# Altium footprint library ICs.PcbLib: 86 footprints (part 4 of 6)
Each footprint in its own frame and in the unit in brackets; x right, y up, seen from the top. Pads: shape width x height; smd on the part's side, far side on the other; paste and mask are expansions set on the pad; w line width, h text height; cw(c..) or ccw(c..) is an arc to the next point about the centre after c.
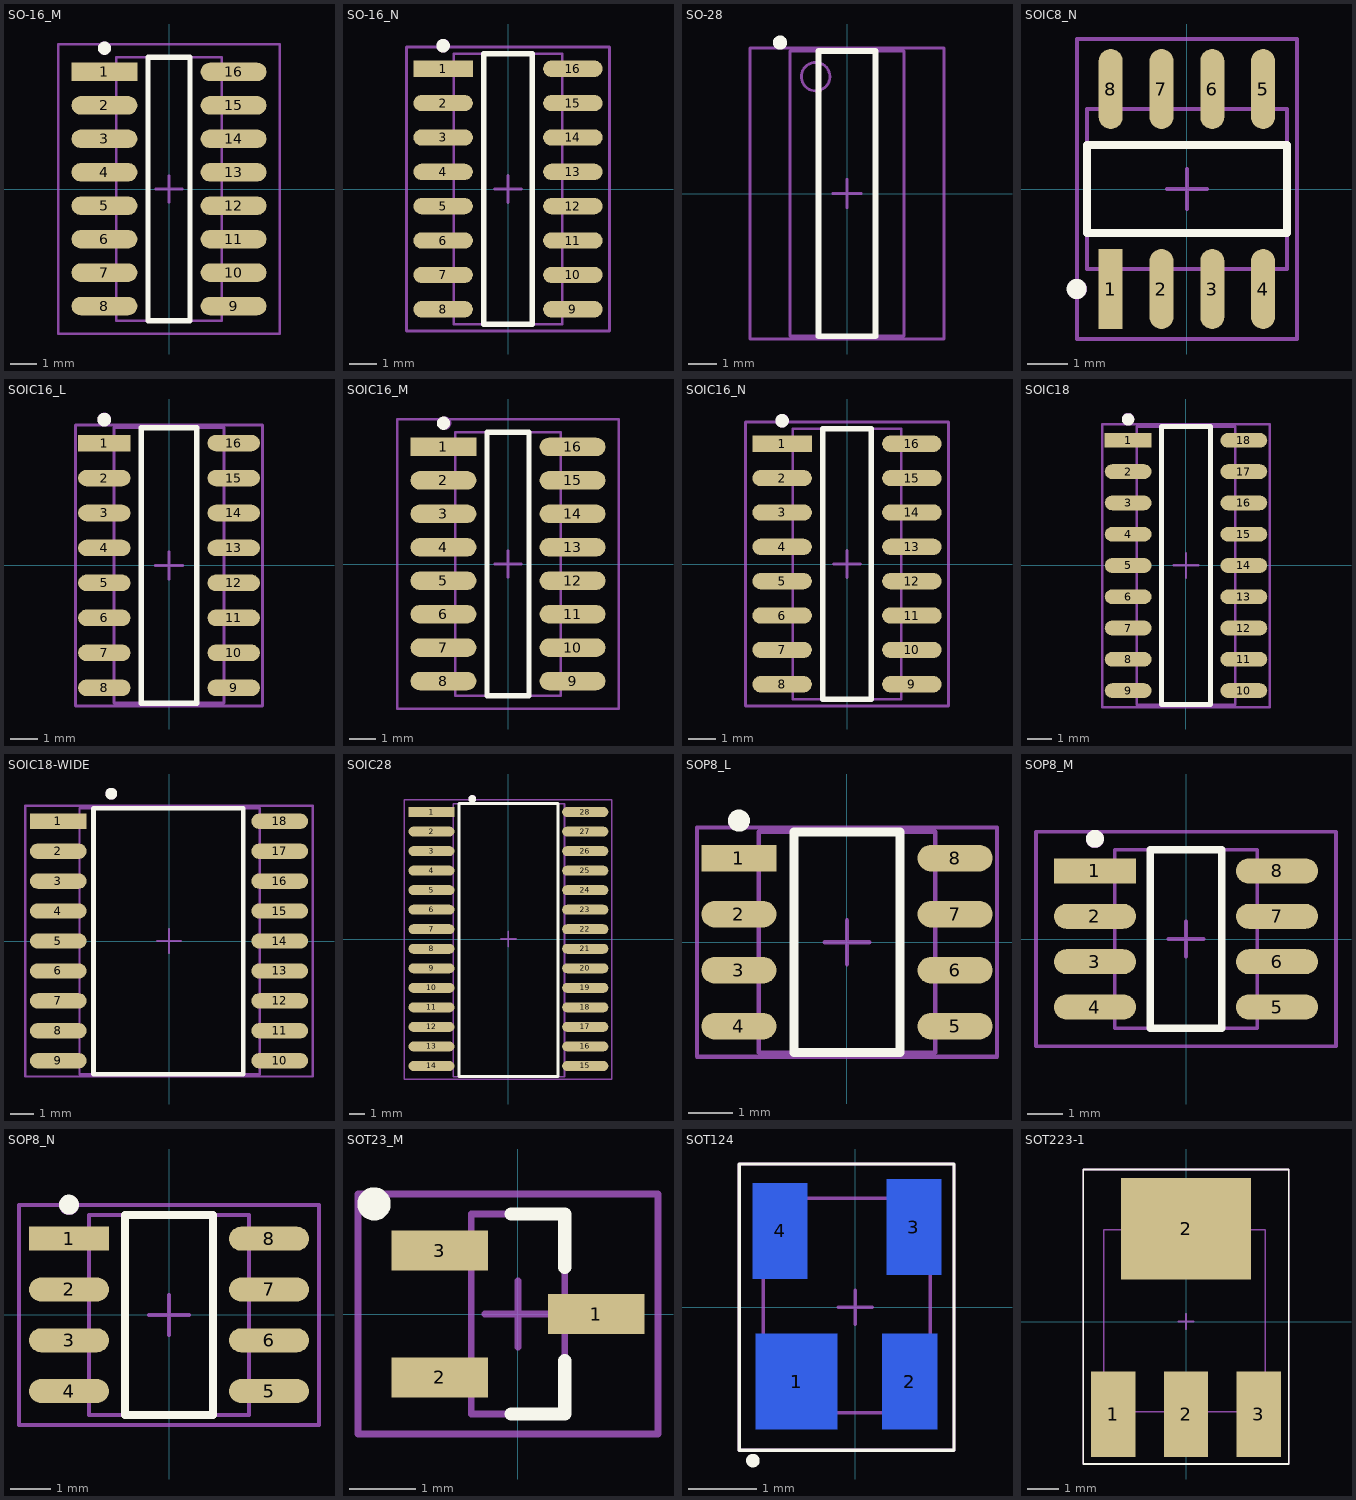
[diagram p3: the footprints below, top view; thin cyan lines are the x and y axes]

## SO-16_M [mm] "SOIC, 16-Leads, Body 9.9x3.9mm, Pitch 1.27mm, IPC Low Density"
height 1.75
pads (16):
  rect 2.5x0.7 smd: 1(-2.45,4.445)
  oval 2.5x0.7 smd: 2(-2.45,3.175) 3(-2.45,1.905) 4(-2.45,0.635) 5(-2.45,-0.635) 6(-2.45,-1.905) 7(-2.45,-3.175) 8(-2.45,-4.445) 9(2.45,-4.445) 10(2.45,-3.175) 11(2.45,-1.905) 12(2.45,-0.635) 13(2.45,0.635) 14(2.45,1.905) 15(2.45,3.175) 16(2.45,4.445)
Top Overlay:
  circle w0.25: c-2.45,5.345 r0.125
  lines w0.2: -0.8,-5 0.8,-5 0.8,5 -0.8,5 -0.8,-5
Mechanical 1:
  circle w0.1: c-2.45,5.35 r0.2
  lines w0.1: -2,-5 2,-5 2,5 -2,5 -2,-5
Mechanical 15:
  lines w0.1: -0.5,0 0.5,0 ; 0,-0.5 0,0.5 ; -4.2,-5.5 4.2,-5.5 4.2,5.5 -4.2,5.5 -4.2,-5.5
3D body "soic-16-n.stp": height 1.95, standoff -0.05, extent -3.04,-5 3.04,5

## SO-16_N [mm] "SOIC, 16-Leads, Body 9.9x3.9mm, Pitch 1.27mm, IPC Medium Density"
height 1.75
pads (16):
  rect 2.2x0.6 smd: 1(-2.4,4.445)
  oval 2.2x0.6 smd: 2(-2.4,3.175) 3(-2.4,1.905) 4(-2.4,0.635) 5(-2.4,-0.635) 6(-2.4,-1.905) 7(-2.4,-3.175) 8(-2.4,-4.445) 9(2.4,-4.445) 10(2.4,-3.175) 11(2.4,-1.905) 12(2.4,-0.635) 13(2.4,0.635) 14(2.4,1.905) 15(2.4,3.175) 16(2.4,4.445)
Top Overlay:
  circle w0.25: c-2.4,5.295 r0.125
  lines w0.2: -0.9,-5 0.9,-5 0.9,5 -0.9,5 -0.9,-5
Mechanical 1:
  circle w0.1: c-2.4,5.3 r0.2
  lines w0.1: -2,-5 2,-5 2,5 -2,5 -2,-5
Mechanical 15:
  lines w0.1: -0.5,0 0.5,0 ; 0,-0.5 0,0.5 ; -3.75,-5.25 3.75,-5.25 3.75,5.25 -3.75,5.25 -3.75,-5.25
3D body "soic-16-n.stp": height 1.95, standoff -0.05, extent -3.04,-5 3.04,5

## SO-28 [mm] "SOIC, 16-Leads, Body 9.9x3.9mm, Pitch 1.27mm, IPC High Density"
height 1.75
Top Overlay:
  circle w0.25: c-2.35,5.295 r0.125
  lines w0.2: -1,-5 -1,5 1,5 1,-5 -1,-5
Mechanical 13:
  circle w0.1: c-1.1,4.1 r0.5
  lines w0.1: -2,-5 -2,5 2,5 2,-5 -2,-5
Mechanical 15:
  lines w0.1: -0.5,0 0.5,0 ; 0,-0.5 0,0.5 ; -3.4,-5.1 -3.4,5.1 3.4,5.1 3.4,-5.1 -3.4,-5.1
3D body: height 1.75, standoff 0, extent -2,-5 2,5

## SOIC8_N [mm] "SOIC, 8-Leads, Body 4.9x3.9mm, Pitch 1.27mm, IPC Medium Density"
height 1.75
pads (8):
  rect 0.6x2 smd: 1(-1.905,-2.5)
  oval 0.6x2 smd: 2(-0.635,-2.5) 3(0.635,-2.5) 4(1.905,-2.5) 5(1.905,2.5) 6(0.635,2.5) 7(-0.635,2.5) 8(-1.905,2.5)
Top Overlay:
  circle w0.25: c-2.755,-2.5 r0.125
  lines w0.2: -2.5,-1.1 2.5,-1.1 2.5,1.1 -2.5,1.1 -2.5,-1.1
Mechanical 1:
  circle w0.1: c-2.75,-2.5 r0.2
  lines w0.1: -2.5,-2 2.5,-2 2.5,2 -2.5,2 -2.5,-2
Mechanical 15:
  lines w0.1: -0.5,0 0.5,0 ; 0,-0.5 0,0.5 ; -2.75,-3.75 2.75,-3.75 2.75,3.75 -2.75,3.75 -2.75,-3.75
3D body "SOIC127P600-8.STEP": height 1.7, standoff 0, extent -2.54,-2.95 2.54,3.05

## SOIC16_L [mm] "SOIC, 16-Leads, Body 9.9x3.9mm, Pitch 1.27mm, IPC High Density"
height 1.91
pads (16):
  rect 1.9x0.6 smd: 1(-2.35,4.445)
  oval 1.9x0.6 smd: 2(-2.35,3.175) 3(-2.35,1.905) 4(-2.35,0.635) 5(-2.35,-0.635) 6(-2.35,-1.905) 7(-2.35,-3.175) 8(-2.35,-4.445) 9(2.35,-4.445) 10(2.35,-3.175) 11(2.35,-1.905) 12(2.35,-0.635) 13(2.35,0.635) 14(2.35,1.905) 15(2.35,3.175) 16(2.35,4.445)
Top Overlay:
  circle w0.25: c-2.35,5.295 r0.125
  lines w0.2: -1,-5 -1,5 1,5 1,-5 -1,-5
Mechanical 1:
  circle w0.1: c-2.35,5.3 r0.2
  lines w0.1: -2,-5 -2,5 2,5 2,-5 -2,-5
Mechanical 15:
  lines w0.1: -0.5,0 0.5,0 ; 0,-0.5 0,0.5 ; -3.4,-5.1 -3.4,5.1 3.4,5.1 3.4,-5.1 -3.4,-5.1
3D body "SOIC127P600-16.STEP": height 1.7, standoff 0, extent -3,-5.08 3,5.08

## SOIC16_M [mm] "SOIC, 16-Leads, Body 9.9x3.9mm, Pitch 1.27mm, IPC Low Density"
height 1.91
pads (16):
  rect 2.5x0.7 smd: 1(-2.45,4.445)
  oval 2.5x0.7 smd: 2(-2.45,3.175) 3(-2.45,1.905) 4(-2.45,0.635) 5(-2.45,-0.635) 6(-2.45,-1.905) 7(-2.45,-3.175) 8(-2.45,-4.445) 9(2.45,-4.445) 10(2.45,-3.175) 11(2.45,-1.905) 12(2.45,-0.635) 13(2.45,0.635) 14(2.45,1.905) 15(2.45,3.175) 16(2.45,4.445)
Top Overlay:
  circle w0.25: c-2.45,5.345 r0.125
  lines w0.2: -0.8,-5 0.8,-5 0.8,5 -0.8,5 -0.8,-5
Mechanical 1:
  circle w0.1: c-2.4,5.35 r0.2
  lines w0.1: -2,-5 2,-5 2,5 -2,5 -2,-5
Mechanical 15:
  lines w0.1: -0.5,0 0.5,0 ; 0,-0.5 0,0.5 ; -4.2,-5.5 4.2,-5.5 4.2,5.5 -4.2,5.5 -4.2,-5.5
3D body "SOIC127P600-16.STEP": height 1.7, standoff 0, extent -3,-5.08 3,5.08

## SOIC16_N [mm] "SOIC, 16-Leads, Body 9.9x3.9mm, Pitch 1.27mm, IPC Medium Density"
height 1.91
pads (16):
  rect 2.2x0.6 smd: 1(-2.4,4.445)
  oval 2.2x0.6 smd: 2(-2.4,3.175) 3(-2.4,1.905) 4(-2.4,0.635) 5(-2.4,-0.635) 6(-2.4,-1.905) 7(-2.4,-3.175) 8(-2.4,-4.445) 9(2.4,-4.445) 10(2.4,-3.175) 11(2.4,-1.905) 12(2.4,-0.635) 13(2.4,0.635) 14(2.4,1.905) 15(2.4,3.175) 16(2.4,4.445)
Top Overlay:
  circle w0.25: c-2.4,5.295 r0.125
  lines w0.2: -0.9,-5 -0.9,5 0.9,5 0.9,-5 -0.9,-5
Mechanical 1:
  circle w0.1: c-2.4,5.3 r0.2
  lines w0.1: -2,-5 -2,5 2,5 2,-5 -2,-5
Mechanical 15:
  lines w0.1: -0.5,0 0.5,0 ; 0,-0.5 0,0.5 ; -3.75,-5.25 -3.75,5.25 3.75,5.25 3.75,-5.25 -3.75,-5.25
3D body "SOIC127P600-16.STEP": height 1.7, standoff 0, extent -3,-5.08 3,5.08

## SOIC18 [mm] "SOIC, 18-Leads, Body 9.9x3.9mm, Pitch 1.27mm, IPC High Density"
height 1.91
pads (18):
  rect 1.9x0.6 smd: 1(-2.35,5.08)
  oval 1.9x0.6 smd: 2(-2.35,3.81) 3(-2.35,2.54) 4(-2.35,1.27) 5(-2.35,0) 6(-2.35,-1.27) 7(-2.35,-2.54) 8(-2.35,-3.81) 9(-2.35,-5.08) 10(2.35,-5.08) 11(2.35,-3.81) 12(2.35,-2.54) 13(2.35,-1.27) 14(2.35,0) 15(2.35,1.27) 16(2.35,2.54) 17(2.35,3.81) 18(2.35,5.08)
Top Overlay:
  circle w0.25: c-2.35,5.93 r0.125
  lines w0.2: -1,-5.65 -1,5.635 1,5.635 1,-5.65 -1,-5.65
Mechanical 1:
  circle w0.1: c-2.35,5.95 r0.2
  lines w0.1: -2,-5.65 -2,5.635 2,5.635 2,-5.65 -2,-5.65
Mechanical 15:
  lines w0.1: -0.5,0 0.5,0 ; 0,-0.5 0,0.5 ; -3.4,-5.75 -3.4,5.735 3.4,5.735 3.4,-5.75 -3.4,-5.75
3D body: height 1.91, standoff 0, extent -2,-5.65 2,5.635

## SOIC18-WIDE [mm] "SOIC, 18-Leads"
height 1.91
pads (18):
  rect 2.4x0.65 smd: 1(-4.7,5.08)
  oval 2.4x0.65 smd: 2(-4.7,3.81) 3(-4.7,2.54) 4(-4.7,1.27) 5(-4.7,0) 6(-4.7,-1.27) 7(-4.7,-2.54) 8(-4.7,-3.81) 9(-4.7,-5.08) 10(4.7,-5.08) 11(4.7,-3.81) 12(4.7,-2.54) 13(4.7,-1.27) 14(4.7,0) 15(4.7,1.27) 16(4.7,2.54) 17(4.7,3.81) 18(4.7,5.08)
Top Overlay:
  circle w0.25: c-2.45,6.25 r0.125
  lines w0.2: -3.2,-5.65 -3.2,5.635 3.15,5.635 3.15,-5.65 -3.2,-5.65
Mechanical 1:
  circle w0.1: c-2.45,6.25 r0.2
  lines w0.1: -3.8,-5.65 -3.8,5.635 3.85,5.635 3.85,-5.65 -3.8,-5.65
Mechanical 15:
  lines w0.1: -0.5,0 0.5,0 ; 0,-0.5 0,0.5 ; -6.1,-5.75 -6.1,5.735 6.1,5.735 6.1,-5.75 -6.1,-5.75
3D body: height 1.91, standoff 0, extent -3.8,-5.65 3.85,5.635

## SOIC28 [mm] "SOIC, 28-Leads, Body 8x18mm, Pitch 1.27mm, IPC High Density"
height 1.91
pads (28):
  rect 3x0.65 smd: 1(-5,8.255)
  oval 3x0.65 smd: 2(-5,6.985) 3(-5,5.715) 4(-5,4.445) 5(-5,3.175) 6(-5,1.905) 7(-5,0.635) 8(-5,-0.635) 9(-5,-1.905) 10(-5,-3.175) 11(-5,-4.445) 12(-5,-5.715) 13(-5,-6.985) 14(-5,-8.255) 15(5,-8.255) 16(5,-6.985) 17(5,-5.715) 18(5,-4.445) 19(5,-3.175) 20(5,-1.905) 21(5,-0.635) 22(5,0.635) 23(5,1.905) 24(5,3.175) 25(5,4.445) 26(5,5.715) 27(5,6.985) 28(5,8.255)
Top Overlay:
  circle w0.25: c-2.35,9.105 r0.125
  lines w0.2: -3.2,-8.95 3.23,-8.95 3.23,8.81 -3.2,8.81 -3.2,-8.95
Mechanical 1:
  circle w0.1: c-2.35,9.125 r0.2
  lines w0.1: -3.6,-8.945 3.65,-8.945 3.65,8.81 -3.6,8.81 -3.6,-8.945
Mechanical 15:
  lines w0.1: -0.5,0 0.5,0 ; 0,-0.5 0,0.5 ; -6.785,-9.11 6.735,-9.11 6.735,9.05 -6.785,9.05 -6.785,-9.11
3D body "SOIC28-Ceramic.step": height 2.5, standoff 0, extent -5.48,-8.995 4.57,8.905

## SOP8_L [mm] "SOIC, 8-Leads, Body 4.9x3.9mm, Pitch 1.27mm, IPC High Density"
height 1.75
pads (8):
  rect 1.7x0.6 smd: 1(-2.45,1.905)
  oval 1.7x0.6 smd: 2(-2.45,0.635) 3(-2.45,-0.635) 4(-2.45,-1.905) 5(2.45,-1.905) 6(2.45,-0.635) 7(2.45,0.635) 8(2.45,1.905)
Top Overlay:
  circle w0.25: c-2.45,2.755 r0.125
  lines w0.2: -1.2,-2.5 -1.2,2.5 1.2,2.5 1.2,-2.5 -1.2,-2.5
Mechanical 1:
  circle w0.1: c-2.5,2.75 r0.15
  lines w0.1: -2,-2.5 -2,2.5 2,2.5 2,-2.5 -2,-2.5
Mechanical 15:
  lines w0.1: -0.5,0 0.5,0 ; 0,-0.5 0,0.5 ; -3.4,-2.6 -3.4,2.6 3.4,2.6 3.4,-2.6 -3.4,-2.6
3D body "SOIC127P600-8.STEP": height 1.7, standoff 0, extent -3,-2.54 3,2.54

## SOP8_M [mm] "SOIC, 8-Leads, Body 4.9x3.9mm, Pitch 1.27mm, IPC Low Density"
height 1.75
pads (8):
  rect 2.3x0.7 smd: 1(-2.55,1.905)
  oval 2.3x0.7 smd: 2(-2.55,0.635) 3(-2.55,-0.635) 4(-2.55,-1.905) 5(2.55,-1.905) 6(2.55,-0.635) 7(2.55,0.635) 8(2.55,1.905)
Top Overlay:
  circle w0.25: c-2.55,2.805 r0.125
  lines w0.2: -1,-2.5 -1,2.5 1,2.5 1,-2.5 -1,-2.5
Mechanical 1:
  circle w0.1: c-2.55,2.8 r0.206
  lines w0.1: -2,-2.5 -2,2.5 2,2.5 2,-2.5 -2,-2.5
Mechanical 15:
  lines w0.1: -0.5,0 0.5,0 ; 0,-0.5 0,0.5 ; -4.2,-3 -4.2,3 4.2,3 4.2,-3 -4.2,-3
3D body "SOIC127P600-8.STEP": height 1.7, standoff 0, extent -3,-2.54 3,2.54

## SOP8_N [mm] "SOIC, 8-Leads, Body 4.9x3.9mm, Pitch 1.27mm, IPC Medium Density"
height 1.75
pads (8):
  rect 2x0.6 smd: 1(-2.5,1.905)
  oval 2x0.6 smd: 2(-2.5,0.635) 3(-2.5,-0.635) 4(-2.5,-1.905) 5(2.5,-1.905) 6(2.5,-0.635) 7(2.5,0.635) 8(2.5,1.905)
Top Overlay:
  circle w0.25: c-2.5,2.755 r0.125
  lines w0.2: -1.1,-2.5 1.1,-2.5 1.1,2.5 -1.1,2.5 -1.1,-2.5
Mechanical 1:
  circle w0.1: c-2.5,2.75 r0.2
  lines w0.1: -2,-2.5 2,-2.5 2,2.5 -2,2.5 -2,-2.5
Mechanical 15:
  lines w0.1: -0.5,0 0.5,0 ; 0,-0.5 0,0.5 ; -3.75,-2.75 3.75,-2.75 3.75,2.75 -3.75,2.75 -3.75,-2.75
3D body "SOIC127P600-8.STEP": height 1.7, standoff 0, extent -3,-2.54 3,2.54

## SOT23_M [mm] "SOT23, 3-Leads, Body 2.9x1.3mm, Pitch 0.95mm, Lead Span 2.3mm - Reverse Pinning, IPC Low Density"
height 1.1
pads (3):
  rect 1.45x0.6 smd: 1(1.175,0) 2(-1.175,-0.95) 3(-1.175,0.95)
Top Overlay:
  circle w0.25: c-2.159,1.651 r0.125
  lines w0.2: -0.1,-1.5 0.7,-1.5 0.7,-0.7 ; -0.1,1.5 0.7,1.5 0.7,0.7
Mechanical 1:
  lines w0.1: -0.7,-1.5 -0.7,1.5 0.7,1.5 0.7,-1.5 -0.7,-1.5
Mechanical 15:
  lines w0.1: -0.5,0 0.5,0 ; 0,-0.5 0,0.5 ; -2.4,-1.8 -2.4,1.8 2.1,1.8 2.1,-1.8 -2.4,-1.8
3D body "SOT-23.STEP": height 1.1, standoff 0, extent -1.15,-1.5 1.15,1.5

## SOT124 [mm]
pads (4):
  rect 1.2x1.4 smd far side: 1(-0.86,-1.092)
  rect 0.8x1.4 smd far side: 2(0.8,-1.092) 3(0.86,1.176) 4(-1.1,1.118)
Top Overlay:
  circle w0.1: c-1.5,-2.25 r0.05
  lines w0.05: -1.7,-2.1 1.45,-2.1 1.45,2.1 -1.7,2.1 -1.7,-2.1
Mechanical 1:
  lines w0.05: -1.35,-1.55 1.1,-1.55 1.1,1.6 -1.15,1.6 -1.35,1.6 -1.35,-1.55
Mechanical 15:
  lines w0.05: -0.25,0 0.25,0 ; 0,-0.25 0,0.25 ; -1.7,-2.1 1.45,-2.1 1.45,2.1 -1.7,2.1 -1.7,-2.1
3D body: height 0.8, standoff 0, extent -1.35,-1.55 1.1,1.6

## SOT223-1 [mm]
pads (4):
  rect 1.4x2.7 smd: 1(-2.3,-2.925) 2(0,-2.925) 3(2.3,-2.925)
  rect 4.1x3.2 smd: 2(0,2.925)
Top Overlay:
  lines w0.05: -3.25,-4.5 3.25,-4.5 3.25,4.8 -3.25,4.8 -3.25,-4.5
Mechanical 1:
  lines w0.05: -2.6,-2.85 2.5,-2.85 2.5,2.9 -2.6,2.9 -2.6,-2.85
Mechanical 15:
  lines w0.05: -0.25,0 0.25,0 ; 0,-0.25 0,0.25 ; -3.25,-4.5 3.25,-4.5 3.25,4.8 -3.25,4.8 -3.25,-4.5
3D body: height 2, standoff 0, extent -2.6,-2.85 2.5,2.9